# Altium schematic symbol library IC_ADI.SCHLIB: 3169 symbols (part 132 of 181) (continued)
## AD9148BBPZRL (continued)

## AD9200ARS
designator U?
Single 10-Bit Analog-to-Digital Converter with Parallel Interface, 80 mW, CMOS, 20MSPS, -40 to +85 degC, RS-28, Tube; Generic Part Number: AD9200; PartNumber: AD9200ARS; Resolution (Bits): 10; Channels: 1; Throughput Rate (SPS): 20M; Interface: Par; DatasheetVersion: Rev.E; PackageVersion: 060106-A; PackageReference: RS-28; PackageDescription: 28-Lead Shrink Small Outline Package [SSOP]; Supplier Part Number 1: AD9200ARS-ND; Supplier Part Number 2: 584-AD9200ARS; RoHS: N; Packing: Tube; Mounting Technology: Surface Mount; Code_JEDEC: MO-150-AH; ComponentLink1Description: Manufacturer URL; ComponentLink2Description: Datasheet; ComponentLink3Description: Package Specification; ComponentLink4Description: Product URL
footprint SSOP28_0.65 (Footprint not found)
pins: 1 AVSS (power) "Analog Ground", 2 DRVDD (power) "Digital Driver Supply", 3 D0 (hiz) "Bit 0, Least Significant Bit", 4 D1 (hiz) "Bit 1", 5 D2 (hiz) "Bit 2", 6 D3 (hiz) "Bit 3", 7 D4 (hiz) "Bit 4", 8 D5 (hiz) "Bit 5", 9 D6 (hiz) "Bit 6", 10 D7 (hiz) "Bit 7", 11 D8 (hiz) "Bit 8", 12 D9 (hiz) "Bit 9, Most Significant Bit", 13 OTR (hiz) "Out-of-Range Indicator", 14 DRVSS (power) "Digital Ground", 15 CLK (in) "Clock Input", 16 THREE-STATE (in) "HI: High Impedance State. LO: Normal Operation", 17 STBY (in) "HI: Power-Down Mode. LO: Normal Operation", 18 REFSENSE (in) "Reference Select", 19 CLAMP (in) "HI: Enable Clamp Mode. LO: No Clamp", 20 CLAMPIN (in) "Clamp Reference Input", 21 REFTS "Top Reference", 22 REFTF "Top Reference Decoupling", 23 MODE (in) "Mode Select", 24 REFBF "Bottom Reference Decoupling", 25 REFBS "Bottom Reference", 26 VREF (out) "Internal Reference Output", 27 AIN (in) "Analog Input", 28 AVDD (power) "Analog Supply"

## AD9200ARSZ
designator U?
Single 10-Bit Analog-to-Digital Converter with Parallel Interface, 80 mW, CMOS, 20MSPS, -40 to +85 degC, RS-28, Pb-Free, Tube; Generic Part Number: AD9200; PartNumber: AD9200ARSZ; Resolution (Bits): 10; Channels: 1; Throughput Rate (SPS): 20M; Interface: Par; DatasheetVersion: Rev.E; PackageVersion: 060106-A; PackageReference: RS-28; PackageDescription: 28-Lead Shrink Small Outline Package [SSOP]; Supplier Part Number 1: AD9200ARSZ-ND; Supplier Part Number 2: 59K7120; Supplier Part Number 3: 584-AD9200ARSZ; RoHS: Y; Packing: Tube; Mounting Technology: Surface Mount; Code_JEDEC: MO-150-AH; ComponentLink1Description: Manufacturer URL; ComponentLink2Description: Datasheet; ComponentLink3Description: Package Specification; ComponentLink4Description: Product URL
footprint SSOP28_0.65 (Footprint not found)
pins: 1 AVSS (power) "Analog Ground", 2 DRVDD (power) "Digital Driver Supply", 3 D0 (hiz) "Bit 0, Least Significant Bit", 4 D1 (hiz) "Bit 1", 5 D2 (hiz) "Bit 2", 6 D3 (hiz) "Bit 3", 7 D4 (hiz) "Bit 4", 8 D5 (hiz) "Bit 5", 9 D6 (hiz) "Bit 6", 10 D7 (hiz) "Bit 7", 11 D8 (hiz) "Bit 8", 12 D9 (hiz) "Bit 9, Most Significant Bit", 13 OTR (hiz) "Out-of-Range Indicator", 14 DRVSS (power) "Digital Ground", 15 CLK (in) "Clock Input", 16 THREE-STATE (in) "HI: High Impedance State. LO: Normal Operation", 17 STBY (in) "HI: Power-Down Mode. LO: Normal Operation", 18 REFSENSE (in) "Reference Select", 19 CLAMP (in) "HI: Enable Clamp Mode. LO: No Clamp", 20 CLAMPIN (in) "Clamp Reference Input", 21 REFTS "Top Reference", 22 REFTF "Top Reference Decoupling", 23 MODE (in) "Mode Select", 24 REFBF "Bottom Reference Decoupling", 25 REFBS "Bottom Reference", 26 VREF (out) "Internal Reference Output", 27 AIN (in) "Analog Input", 28 AVDD (power) "Analog Supply"

## AD9200JRSZ
designator U?
Single 10-Bit Analog-to-Digital Converter with Parallel Interface, 80 mW, CMOS, 20MSPS, 0 to +70 degC, RS-28, Pb-Free, Tube; Generic Part Number: AD9200; PartNumber: AD9200JRSZ; Resolution (Bits): 10; Channels: 1; Throughput Rate (SPS): 20M; Interface: Par; DatasheetVersion: Rev.E; PackageVersion: 060106-A; PackageReference: RS-28; PackageDescription: 28-Lead Shrink Small Outline Package [SSOP]; Supplier Part Number 1: AD9200JRSZ-ND; Supplier Part Number 2: 59K7122; Supplier Part Number 3: 584-AD9200JRSZ; RoHS: Y; Packing: Tube; Mounting Technology: Surface Mount; Code_JEDEC: MO-150-AH; ComponentLink1Description: Manufacturer URL; ComponentLink2Description: Datasheet; ComponentLink3Description: Package Specification; ComponentLink4Description: Product URL
footprint SSOP28_0.65 (Footprint not found)
pins: 1 AVSS (power) "Analog Ground", 2 DRVDD (power) "Digital Driver Supply", 3 D0 (hiz) "Bit 0, Least Significant Bit", 4 D1 (hiz) "Bit 1", 5 D2 (hiz) "Bit 2", 6 D3 (hiz) "Bit 3", 7 D4 (hiz) "Bit 4", 8 D5 (hiz) "Bit 5", 9 D6 (hiz) "Bit 6", 10 D7 (hiz) "Bit 7", 11 D8 (hiz) "Bit 8", 12 D9 (hiz) "Bit 9, Most Significant Bit", 13 OTR (hiz) "Out-of-Range Indicator", 14 DRVSS (power) "Digital Ground", 15 CLK (in) "Clock Input", 16 THREE-STATE (in) "HI: High Impedance State. LO: Normal Operation", 17 STBY (in) "HI: Power-Down Mode. LO: Normal Operation", 18 REFSENSE (in) "Reference Select", 19 CLAMP (in) "HI: Enable Clamp Mode. LO: No Clamp", 20 CLAMPIN (in) "Clamp Reference Input", 21 REFTS "Top Reference", 22 REFTF "Top Reference Decoupling", 23 MODE (in) "Mode Select", 24 REFBF "Bottom Reference Decoupling", 25 REFBS "Bottom Reference", 26 VREF (out) "Internal Reference Output", 27 AIN (in) "Analog Input", 28 AVDD (power) "Analog Supply"

## AD9201ARS
designator U?
Dual 10-Bit Analog-to-Digital Converter with Parallel Interface, 20MSPS, -40 to +85 degC, RS-28, Tube; Generic Part Number: AD9201; PartNumber: AD9201ARS; Resolution (Bits): 10; Channels: 2; Throughput Rate (SPS): 20M; Interface: Par; DatasheetVersion: Rev.D; PackageVersion: 060106-A; PackageReference: RS-28; PackageDescription: 28-Lead Shrink Small Outline Package [SSOP]; Supplier Part Number 1: AD9201ARS-ND; Supplier Part Number 2: 117109; Supplier Part Number 3: 584-AD9201ARS; RoHS: N; Packing: Tube; Mounting Technology: Surface Mount; Code_JEDEC: MO-150-AH; ComponentLink1Description: Manufacturer URL; ComponentLink2Description: Datasheet; ComponentLink3Description: Package Specification; ComponentLink4Description: Product URL
footprint SSOP28_0.65 (Footprint not found)
pins: 1 DVSS (power) "Digital Ground", 2 DVDD (power) "Digital Supply", 3 D0 (hiz) "Bit 0 (LSB)", 4 D1 (hiz) "Bit 1", 5 D2 (hiz) "Bit 2", 6 D3 (hiz) "Bit 3", 7 D4 (hiz) "Bit 4", 8 D5 (hiz) "Bit 5", 9 D6 (hiz) "Bit 6", 10 D7 (hiz) "Bit 7", 11 D8 (hiz) "Bit 8", 12 D9 (hiz) "Bit 9 (MSB)", 13 SELECT (in) "Hi I Channel Out, Lo Q Channel Out", 14 CLOCK (in) "Clock", 15 SLEEP (in) "Hi Power Down, Lo Normal Operation", 16 INA-I (in) "I Channel, A Input", 17 INB-I (in) "I Channel, B Input", 18 REFT-I "Top Reference Decoupling, I Channel", 19 REFB-I "Bottom Reference Decoupling, I Channel", 20 AVSS (power) "Analog Ground", 21 REFSENSE (in) "Reference Select", 22 VREF (out) "Internal Reference Output", 23 AVDD (power) "Analog Supply", 24 REFB-Q "Bottom Reference Decoupling, Q Channel", 25 REFT-Q "Top Reference Decoupling, Q Channel", 26 INB-Q (in) "Q Channel, B Input", 27 INA-Q (in) "Q Channel, A Input", 28 CHIP-SELECT (in) "Hi-High Impedance, Lo-Normal Operation"

## AD9201ARSRL
designator U?
Dual 10-Bit Analog-to-Digital Converter with Parallel Interface, 20MSPS, -40 to +85 degC, RS-28, Reel; Generic Part Number: AD9201; PartNumber: AD9201ARSRL; Resolution (Bits): 10; Channels: 2; Throughput Rate (SPS): 20M; Interface: Par; DatasheetVersion: Rev.D; PackageVersion: 060106-A; PackageReference: RS-28; PackageDescription: 28-Lead Shrink Small Outline Package [SSOP]; Supplier Part Number 1: AD9201ARSRL-ND; Supplier Part Number 2: 584-AD9201ARSR; RoHS: N; Packing: Reel; Mounting Technology: Surface Mount; Code_JEDEC: MO-150-AH; ComponentLink1Description: Manufacturer URL; ComponentLink2Description: Datasheet; ComponentLink3Description: Package Specification; ComponentLink4Description: Product URL
footprint SSOP28_0.65 (Footprint not found)
pins: 1 DVSS (power) "Digital Ground", 2 DVDD (power) "Digital Supply", 3 D0 (hiz) "Bit 0 (LSB)", 4 D1 (hiz) "Bit 1", 5 D2 (hiz) "Bit 2", 6 D3 (hiz) "Bit 3", 7 D4 (hiz) "Bit 4", 8 D5 (hiz) "Bit 5", 9 D6 (hiz) "Bit 6", 10 D7 (hiz) "Bit 7", 11 D8 (hiz) "Bit 8", 12 D9 (hiz) "Bit 9 (MSB)", 13 SELECT (in) "Hi I Channel Out, Lo Q Channel Out", 14 CLOCK (in) "Clock", 15 SLEEP (in) "Hi Power Down, Lo Normal Operation", 16 INA-I (in) "I Channel, A Input", 17 INB-I (in) "I Channel, B Input", 18 REFT-I "Top Reference Decoupling, I Channel", 19 REFB-I "Bottom Reference Decoupling, I Channel", 20 AVSS (power) "Analog Ground", 21 REFSENSE (in) "Reference Select", 22 VREF (out) "Internal Reference Output", 23 AVDD (power) "Analog Supply", 24 REFB-Q "Bottom Reference Decoupling, Q Channel", 25 REFT-Q "Top Reference Decoupling, Q Channel", 26 INB-Q (in) "Q Channel, B Input", 27 INA-Q (in) "Q Channel, A Input", 28 CHIP-SELECT (in) "Hi-High Impedance, Lo-Normal Operation"

## AD9201ARSZ
designator U?
Dual 10-Bit Analog-to-Digital Converter with Parallel Interface, 20MSPS, -40 to +85 degC, RS-28, Pb-Free, Tube; Generic Part Number: AD9201; PartNumber: AD9201ARSZ; Resolution (Bits): 10; Channels: 2; Throughput Rate (SPS): 20M; Interface: Par; DatasheetVersion: Rev.D; PackageVersion: 060106-A; PackageReference: RS-28; PackageDescription: 28-Lead Shrink Small Outline Package [SSOP]; Supplier Part Number 1: AD9201ARSZ-ND; Supplier Part Number 2: 1079291; Supplier Part Number 3: 19M1005; Supplier Part Number 4: 584-AD9201ARSZ; RoHS: Y; Packing: Tube; Mounting Technology: Surface Mount; Code_JEDEC: MO-150-AH; ComponentLink1Description: Manufacturer URL; ComponentLink2Description: Datasheet; ComponentLink3Description: Package Specification; ComponentLink4Description: Product URL
footprint SSOP28_0.65 (Footprint not found)
pins: 1 DVSS (power) "Digital Ground", 2 DVDD (power) "Digital Supply", 3 D0 (hiz) "Bit 0 (LSB)", 4 D1 (hiz) "Bit 1", 5 D2 (hiz) "Bit 2", 6 D3 (hiz) "Bit 3", 7 D4 (hiz) "Bit 4", 8 D5 (hiz) "Bit 5", 9 D6 (hiz) "Bit 6", 10 D7 (hiz) "Bit 7", 11 D8 (hiz) "Bit 8", 12 D9 (hiz) "Bit 9 (MSB)", 13 SELECT (in) "Hi I Channel Out, Lo Q Channel Out", 14 CLOCK (in) "Clock", 15 SLEEP (in) "Hi Power Down, Lo Normal Operation", 16 INA-I (in) "I Channel, A Input", 17 INB-I (in) "I Channel, B Input", 18 REFT-I "Top Reference Decoupling, I Channel", 19 REFB-I "Bottom Reference Decoupling, I Channel", 20 AVSS (power) "Analog Ground", 21 REFSENSE (in) "Reference Select", 22 VREF (out) "Internal Reference Output", 23 AVDD (power) "Analog Supply", 24 REFB-Q "Bottom Reference Decoupling, Q Channel", 25 REFT-Q "Top Reference Decoupling, Q Channel", 26 INB-Q (in) "Q Channel, B Input", 27 INA-Q (in) "Q Channel, A Input", 28 CHIP-SELECT (in) "Hi-High Impedance, Lo-Normal Operation"

## AD9201ARSZRL
designator U?
Dual 10-Bit Analog-to-Digital Converter with Parallel Interface, 20MSPS, -40 to +85 degC, RS-28, Pb-Free, Reel; Generic Part Number: AD9201; PartNumber: AD9201ARSZRL; Resolution (Bits): 10; Channels: 2; Throughput Rate (SPS): 20M; Interface: Par; DatasheetVersion: Rev.D; PackageVersion: 060106-A; PackageReference: RS-28; PackageDescription: 28-Lead Shrink Small Outline Package [SSOP]; Supplier Part Number 1: AD9201ARSZRLTR-ND; Supplier Part Number 2: AD9201ARSZRLCT-ND; Supplier Part Number 3: AD9201ARSZRLDKR-ND; Supplier Part Number 4: 28M4165; Supplier Part Number 5: 584-AD9201ARSZR; RoHS: Y; Packing: Reel; Mounting Technology: Surface Mount; Code_JEDEC: MO-150-AH; ComponentLink1Description: Manufacturer URL; ComponentLink2Description: Datasheet; ComponentLink3Description: Package Specification; ComponentLink4Description: Product URL
footprint SSOP28_0.65 (Footprint not found)
pins: 1 DVSS (power) "Digital Ground", 2 DVDD (power) "Digital Supply", 3 D0 (hiz) "Bit 0 (LSB)", 4 D1 (hiz) "Bit 1", 5 D2 (hiz) "Bit 2", 6 D3 (hiz) "Bit 3", 7 D4 (hiz) "Bit 4", 8 D5 (hiz) "Bit 5", 9 D6 (hiz) "Bit 6", 10 D7 (hiz) "Bit 7", 11 D8 (hiz) "Bit 8", 12 D9 (hiz) "Bit 9 (MSB)", 13 SELECT (in) "Hi I Channel Out, Lo Q Channel Out", 14 CLOCK (in) "Clock", 15 SLEEP (in) "Hi Power Down, Lo Normal Operation", 16 INA-I (in) "I Channel, A Input", 17 INB-I (in) "I Channel, B Input", 18 REFT-I "Top Reference Decoupling, I Channel", 19 REFB-I "Bottom Reference Decoupling, I Channel", 20 AVSS (power) "Analog Ground", 21 REFSENSE (in) "Reference Select", 22 VREF (out) "Internal Reference Output", 23 AVDD (power) "Analog Supply", 24 REFB-Q "Bottom Reference Decoupling, Q Channel", 25 REFT-Q "Top Reference Decoupling, Q Channel", 26 INB-Q (in) "Q Channel, B Input", 27 INA-Q (in) "Q Channel, A Input", 28 CHIP-SELECT (in) "Hi-High Impedance, Lo-Normal Operation"

## AD9203ARU
designator U?
Single 10-Bit Analog-to-Digital Converter with Parallel Interface, 74 mW, 40MSPS, -40 to +85 degC, RU-28, Tube; Generic Part Number: AD9203; PartNumber: AD9203ARU; Resolution (Bits): 10; Channels: 1; Throughput Rate (SPS): 40M; Interface: Par; DatasheetVersion: Rev.B; PackageVersion: 2005; PackageReference: RU-28; PackageDescription: 28-Lead Thin Shrink Small Outline Package [TSSOP]; Supplier Part Number 1: AD9203ARU-ND; Supplier Part Number 2: 584-AD9203ARU; RoHS: N; Packing: Tube; Mounting Technology: Surface Mount; Code_JEDEC: MO-153-AE; ComponentLink1Description: Manufacturer URL; ComponentLink2Description: Datasheet; ComponentLink3Description: Package Specification; ComponentLink4Description: Product URL
footprint TSSOP28_0.65 (Footprint not found)
pins: 1 DRVSS (power) "Digital Ground.", 2 DRVDD (power) "Digital Supply.", 3 D0 (hiz) "Bit 0, Least Significant Bit.", 4 D1 (hiz) "Bit 1.", 5 D2 (hiz) "Bit 2.", 6 D3 (hiz) "Bit 3.", 7 D4 (hiz) "Bit 4.", 8 D5 (hiz) "Bit 5.", 9 D6 (hiz) "Bit 6.", 10 D7 (hiz) "Bit 7.", 11 D8 (hiz) "Bit 8.", 12 D9 (hiz) "Bit 9, Most Significant Bit.", 13 OTR (out) "Out-of-Range Indicator.", 14 DFS (in) "Data Format Select HI: Twos Complement; LO: Straight Binary.", 15 CLK (in) "Clock Input.", 16 3-STATE (in) "HI: High Impedance State Output; LO: Active Digital Output Drives.", 17 STBY (in) "HI: Power-Down Mode; LO: Normal Operation.", 18 REFSENSE (in) "Reference Select.", 19 CLAMP (in) "HI: Enable Clamp; LO: Open Clamp.", 20 CLAMPIN (in) "Clamp Signal Input.", 21 PWRCON (in) "Power Control Input.", 22 REFTF "Top Reference Decoupling.", 23 VREF (io) "Reference In/Out.", 24 REFBF "Bottom Reference Decoupling.", 25 AINP (in) "Noninverting Analog Input.", 26 AINN (in) "Inverting Analog Input.", 27 AVSS (power) "Analog Ground.", 28 AVDD (power) "Analog Supply."

## AD9203ARUZ
designator U?
Single 10-Bit Analog-to-Digital Converter with Parallel Interface, 74 mW, 40MSPS, -40 to +85 degC, RU-28, Pb-Free,Tube; Generic Part Number: AD9203; PartNumber: AD9203ARUZ; Resolution (Bits): 10; Channels: 1; Throughput Rate (SPS): 40M; Interface: Par; DatasheetVersion: Rev.B; PackageVersion: 2005; PackageReference: RU-28; PackageDescription: 28-Lead Thin Shrink Small Outline Package [TSSOP]; Supplier Part Number 1: AD9203ARUZ-ND; Supplier Part Number 2: 2305578; Supplier Part Number 3: 82H3049; Supplier Part Number 4: 584-AD9203ARUZ; RoHS: Y; Packing: Tube; Mounting Technology: Surface Mount; Code_JEDEC: MO-153-AE; ComponentLink1Description: Manufacturer URL; ComponentLink2Description: Datasheet; ComponentLink3Description: Package Specification; ComponentLink4Description: Product URL
footprint TSSOP28_0.65 (Footprint not found)
pins: 1 DRVSS (power) "Digital Ground.", 2 DRVDD (power) "Digital Supply.", 3 D0 (hiz) "Bit 0, Least Significant Bit.", 4 D1 (hiz) "Bit 1.", 5 D2 (hiz) "Bit 2.", 6 D3 (hiz) "Bit 3.", 7 D4 (hiz) "Bit 4.", 8 D5 (hiz) "Bit 5.", 9 D6 (hiz) "Bit 6.", 10 D7 (hiz) "Bit 7.", 11 D8 (hiz) "Bit 8.", 12 D9 (hiz) "Bit 9, Most Significant Bit.", 13 OTR (out) "Out-of-Range Indicator.", 14 DFS (in) "Data Format Select HI: Twos Complement; LO: Straight Binary.", 15 CLK (in) "Clock Input.", 16 3-STATE (in) "HI: High Impedance State Output; LO: Active Digital Output Drives.", 17 STBY (in) "HI: Power-Down Mode; LO: Normal Operation.", 18 REFSENSE (in) "Reference Select.", 19 CLAMP (in) "HI: Enable Clamp; LO: Open Clamp.", 20 CLAMPIN (in) "Clamp Signal Input.", 21 PWRCON (in) "Power Control Input.", 22 REFTF "Top Reference Decoupling.", 23 VREF (io) "Reference In/Out.", 24 REFBF "Bottom Reference Decoupling.", 25 AINP (in) "Noninverting Analog Input.", 26 AINN (in) "Inverting Analog Input.", 27 AVSS (power) "Analog Ground.", 28 AVDD (power) "Analog Supply."

## AD9203ARUZRL7
designator U?
Single 10-Bit Analog-to-Digital Converter with Parallel Interface, 74 mW, 40MSPS, 0 to +70 degC, RU-28, Pb-Free, Reel; Generic Part Number: AD9203; PartNumber: AD9203ARUZRL7; Resolution (Bits): 10; Channels: 1; Throughput Rate (SPS): 40M; Interface: Par; DatasheetVersion: Rev.B; PackageVersion: 2005; PackageReference: RU-28; PackageDescription: 28-Lead Thin Shrink Small Outline Package [TSSOP]; Supplier Part Number 1: AD9203ARUZRL7TR-ND; Supplier Part Number 2: AD9203ARUZRL7CT-ND; Supplier Part Number 3: AD9203ARUZRL7DKR-ND; Supplier Part Number 4: 82H3050; Supplier Part Number 5: 584-AD9203ARUZR7; RoHS: Y; Packing: Reel; Mounting Technology: Surface Mount; Code_JEDEC: MO-153-AE; ComponentLink1Description: Manufacturer URL; ComponentLink2Description: Datasheet; ComponentLink3Description: Package Specification; ComponentLink4Description: Product URL
footprint TSSOP28_0.65 (Footprint not found)
pins: 1 DRVSS (power) "Digital Ground.", 2 DRVDD (power) "Digital Supply.", 3 D0 (hiz) "Bit 0, Least Significant Bit.", 4 D1 (hiz) "Bit 1.", 5 D2 (hiz) "Bit 2.", 6 D3 (hiz) "Bit 3.", 7 D4 (hiz) "Bit 4.", 8 D5 (hiz) "Bit 5.", 9 D6 (hiz) "Bit 6.", 10 D7 (hiz) "Bit 7.", 11 D8 (hiz) "Bit 8.", 12 D9 (hiz) "Bit 9, Most Significant Bit.", 13 OTR (out) "Out-of-Range Indicator.", 14 DFS (in) "Data Format Select HI: Twos Complement; LO: Straight Binary.", 15 CLK (in) "Clock Input.", 16 3-STATE (in) "HI: High Impedance State Output; LO: Active Digital Output Drives.", 17 STBY (in) "HI: Power-Down Mode; LO: Normal Operation.", 18 REFSENSE (in) "Reference Select.", 19 CLAMP (in) "HI: Enable Clamp; LO: Open Clamp.", 20 CLAMPIN (in) "Clamp Signal Input.", 21 PWRCON (in) "Power Control Input.", 22 REFTF "Top Reference Decoupling.", 23 VREF (io) "Reference In/Out.", 24 REFBF "Bottom Reference Decoupling.", 25 AINP (in) "Noninverting Analog Input.", 26 AINN (in) "Inverting Analog Input.", 27 AVSS (power) "Analog Ground.", 28 AVDD (power) "Analog Supply."

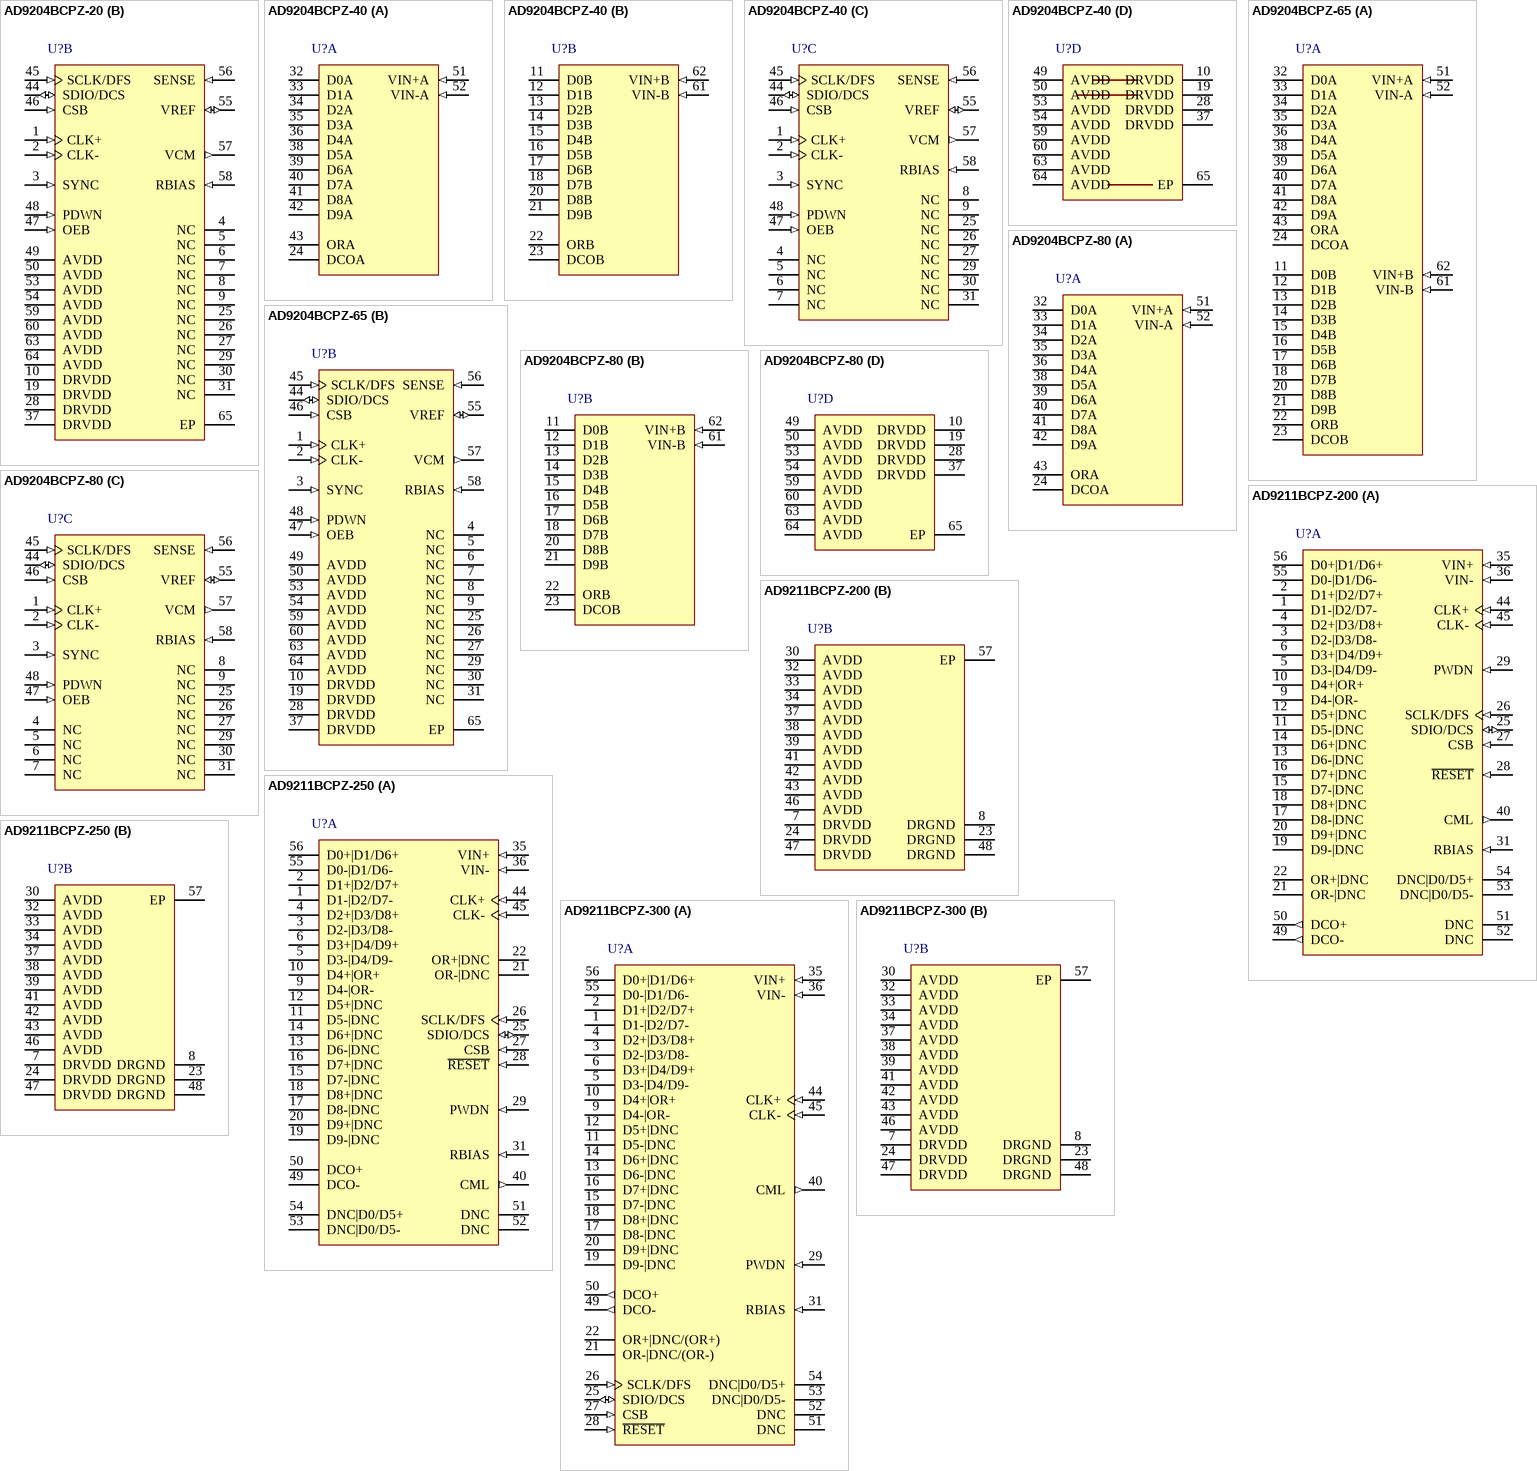
[diagram p104: symbols AD9204BCPZ-20 to AD9211BCPZ-300]

## AD9204BCPZ-20
designator U?
Dual 10-Bit Analog-to-Digital Converter with Parallel Interface, 1.8 V, 20MSPS, -40 to +85 degC, CP-64-4, Pb-Free, Tray; Generic Part Number: AD9204-20; PartNumber: AD9204BCPZ-20; Resolution (Bits): 10; Channels: 2; Throughput Rate (SPS): 20M; Interface: Par; DatasheetVersion: Rev.0; PackageVersion: 051007-C; PackageReference: CP-64-4; PackageDescription: 64-Lead Lead Frame Chip Scale Package [LFCSP_VQ] 9 x 9 mm Body, Very Thin Quad; Supplier Part Number 1: AD9204BCPZ-20-ND; Supplier Part Number 2: 26R2489; Supplier Part Number 3: 584-AD9204BCPZ-20; RoHS: Y; Packing: Tray; Mounting Technology: Surface Mount; Code_JEDEC: MO-220-VMMD-4; ComponentLink1Description: Manufacturer URL; ComponentLink2Description: Datasheet; ComponentLink3Description: Package Specification; ComponentLink4Description: Product URL
footprint QFN64_0.5-PAD(9X9) (Footprint not found)
part A pins: 11 D0B (LSB) (hiz) "Channel B Digital Outputs.D9B = MSB.", 12 D1B (hiz) "Channel B Digital Outputs.D9B = MSB.", 13 D2B (hiz) "Channel B Digital Outputs.D9B = MSB.", 14 D3B (hiz) "Channel B Digital Outputs.D9B = MSB.", 15 D4B (hiz) "Channel B Digital Outputs.D9B = MSB.", 16 D5B (hiz) "Channel B Digital Outputs.D9B = MSB.", 17 D6B (hiz) "Channel B Digital Outputs.D9B = MSB.", 18 D7B (hiz) "Channel B Digital Outputs.D9B = MSB.", 20 D8B (hiz) "Channel B Digital Outputs.D9B = MSB.", 21 D9B (MSB) (hiz) "Channel B Digital Outputs.D9B = MSB.", 22 ORB (hiz) "Channel B Out-of-Range Digital Output.", 23 DCOB (hiz) "Channel B Data Clock Digital Output.", 24 DCOA (hiz) "Channel A Data Clock Digital Output.", 32 D0A (LSB) (hiz) "Channel A Digital Outputs.D9A = MSB.", 33 D1A (hiz) "Channel A Digital Outputs.D9A = MSB.", 34 D2A (hiz) "Channel A Digital Outputs.D9A = MSB.", 35 D3A (hiz) "Channel A Digital Outputs.D9A = MSB.", 36 D4A (hiz) "Channel A Digital Outputs.D9A = MSB.", 38 D5A (hiz) "Channel A Digital Outputs.D9A = MSB.", 39 D6A (hiz) "Channel A Digital Outputs.D9A = MSB.", 40 D7A (hiz) "Channel A Digital Outputs.D9A = MSB.", 41 D8A (hiz) "Channel A Digital Outputs.D9A = MSB.", 42 D9A (MSB) (hiz) "Channel A Digital Outputs.D9A = MSB.", 43 ORA (hiz) "Channel A Out-of-Range Digital Output.", 51 VIN+A (in) "Channel A Analog Inputs.", 52 VIN-A (in) "Channel A Analog Inputs.", 61 VIN-B (in) "Channel B Analog Inputs.", 62 VIN+B (in) "Channel B Analog Inputs."
part B pins: 1 CLK+ (in) "Differential Encode Clock. PECL, LVDS, or 1.8 V CMOS inputs.", 2 CLK- (in) "Differential Encode Clock. PECL, LVDS, or 1.8 V CMOS inputs.", 3 SYNC (in) "Digital Input. SYNC input to clock divider. 30 k ohm internal pull-down", 4 NC "Do Not Connect.", 5 NC "Do Not Connect.", 6 NC "Do Not Connect.", 7 NC "Do Not Connect.", 8 NC "Do Not Connect.", 9 NC "Do Not Connect.", 10 DRVDD (power) "Digital Output Driver Supply (1.8 V to 3.3 V).", 19 DRVDD (power) "Digital Output Driver Supply (1.8 V to 3.3 V).", 25 NC "Do Not Connect.", 26 NC "Do Not Connect.", 27 NC "Do Not Connect.", 28 DRVDD (power) "Digital Output Driver Supply (1.8 V to 3.3 V).", 29 NC "Do Not Connect.", 30 NC "Do Not Connect.", 31 NC "Do Not Connect.", 37 DRVDD (power) "Digital Output Driver Supply (1.8 V to 3.3 V).", 44 SDIO/DCS (io) "SPI Data Input/Output (SDIO). Bidirectional SPI Data I/O in SPI mode. 30 k ohm internal pulldown in SPI mode.  Duty Cycle Stabilizer (DCS). Static enable input for duty cycle stabilizer in non-SPI mode. 30 k ohm  internal (See Datasheet)", 45 SCLK/DFS (in) "SPI Clock (SCLK) Input in SPI mode. 30 k ohm internal pull-down.Data Format Select (DFS). Static control of data output format in non-SPI mode. 30 kO internal pull-down.DFS high = twos complement output.  DFS low = offset (See Datasheet)", 46 CSB (in) "SPI Chip Select. Active low enable; 30 k ohm internal pull-up", 47 OEB (in) "Digital Input. Enable Channel A and Channel B digital outputs if low, three-state outputs if high. 30 kohm internal pull-down.", 48 PDWN (in) "Digital Input. 30 kohm internal pull-down.PDWN high = power-down device.PDWN low = run device, normal operation.", 49 AVDD (power) "1.8 V Analog Supply Pins", 50 AVDD (power) "1.8 V Analog Supply Pins", 53 AVDD (power) "1.8 V Analog Supply Pins", 54 AVDD (power) "1.8 V Analog Supply Pins", 55 VREF (io) "Voltage Reference Input/Output", 56 SENSE (in) "Reference Mode Selection", 57 VCM (out) "Analog output voltage at midsupply to set common mode of the analog inputs.", 58 RBIAS (in) "Sets Analog Current Bias. Connect to 10 kohm (1% tolerance) resistor to ground.", 59 AVDD (power) "1.8 V Analog Supply Pins", 60 AVDD (power) "1.8 V Analog Supply Pins", 63 AVDD (power) "1.8 V Analog Supply Pins", 64 AVDD (power) "1.8 V Analog Supply Pins", 65 EP (power) "Exposed paddle is the only ground connection for the chip. Must be connected to PCB AGND."

## AD9204BCPZ-40
designator U?
Dual 10-Bit Analog-to-Digital Converter with Parallel Interface, 1.8 V, 40MSPS, -40 to +85 degC, CP-64-4, Pb-Free, Tray; Generic Part Number: AD9204-40; PartNumber: AD9204BCPZ-40; Resolution (Bits): 10; Channels: 2; Throughput Rate (SPS): 40M; Interface: Par; DatasheetVersion: Rev.0; PackageVersion: 051007-C; PackageReference: CP-64-4; PackageDescription: 64-Lead Lead Frame Chip Scale Package [LFCSP_VQ] 9 x 9 mm Body, Very Thin Quad; Supplier Part Number 1: AD9204BCPZ-40-ND; Supplier Part Number 2: 584-AD9204BCPZ-40; RoHS: Y; Packing: Tray; Mounting Technology: Surface Mount; Code_JEDEC: MO-220-VMMD-4; ComponentLink1Description: Manufacturer URL; ComponentLink2Description: Datasheet; ComponentLink3Description: Package Specification; ComponentLink4Description: Product URL
footprint QFN64_0.5-PAD(9X9) (Footprint not found)
part A pins: 24 DCOA (hiz) "Channel A Data Clock Digital Output.", 32 D0A (hiz) "Channel A Digital Output", 33 D1A (hiz) "Channel A Digital Output", 34 D2A (hiz) "Channel A Digital Output.", 35 D3A (hiz) "Channel A Digital Output", 36 D4A (hiz) "Channel A Digital Output", 38 D5A (hiz) "Channel A Digital Output.", 39 D6A (hiz) "Channel A Digital Output.", 40 D7A (hiz) "Channel A Digital Output", 41 D8A (hiz) "Channel A Digital Output", 42 D9A (hiz) "Channel A Digital Output D9A = MSB.", 43 ORA (hiz) "Channel A Out-of-Range Digital Output.", 51 VIN+A (in) "Channel A Analog Inputs.", 52 VIN-A (in) "Channel A Analog Inputs."
part B pins: 11 D0B (hiz) "Channel B Digital Output.", 12 D1B (hiz) "Channel B Digital Output.", 13 D2B (hiz) "Channel B Digital Output", 14 D3B (hiz) "Channel B Digital Output.", 15 D4B (hiz) "Channel B Digital Output.", 16 D5B (hiz) "Channel B Digital Output.", 17 D6B (hiz) "Channel B Digital Output", 18 D7B (hiz) "Channel B Digital Output.", 20 D8B (hiz) "Channel B Digital Output.", 21 D9B (hiz) "Channel B Digital Output D9B = MSB.", 22 ORB (hiz) "Channel B Out-of-Range Digital Output.", 23 DCOB (hiz) "Channel B Data Clock Digital Output.", 61 VIN-B (in) "Channel B Analog Inputs.", 62 VIN+B (in) "Channel B Analog Inputs."
part C pins: 1 CLK+ (in) "Differential Encode Clock. PECL, LVDS, or 1.8 V CMOS inputs.", 2 CLK- (in) "Differential Encode Clock. PECL, LVDS, or 1.8 V CMOS inputs.", 3 SYNC (in) "Digital Input. SYNC input to clock divider. 30 kohm internal pull-down.", 4 NC "Do Not Connect.", 5 NC "Do Not Connect.", 6 NC "Do Not Connect.", 7 NC "Do Not Connect.", 8 NC "Do Not Connect.", 9 NC "Do Not Connect.", 25 NC "Do Not Connect.", 26 NC "Do Not Connect.", 27 NC "Do Not Connect.", 29 NC "Do Not Connect.", 30 NC "Do Not Connect.", 31 NC "Do Not Connect.", 44 SDIO/DCS (io) "SPI Data Input/Output (SDIO). Bidirectional SPI Data I/O in SPI mode. 30 k ohm internal pull-down in SPI mode.Duty Cycle Stabilizer (DCS). Static enable input for duty cycle stabilizer in non-SPI mode. 30 k ohm internal pull-up in (See Datasheet)", 45 SCLK/DFS (in) "SPI Clock (SCLK) Input in SPI mode. 30 k ohm internal pull-down.Data Format Select (DFS). Static control of data output format in non-SPI mode. 30 k ohm internal pull-down. DFS high = twos complement output. DFS low = offset (See Datasheet)", 46 CSB (in) "SPI Chip Select. Active low enable; 30 kohm internal pull-up.", 47 OEB (in) "Digital Input. Enable Channel A and Channel B digital outputs if low, three-state outputs if high. 30 k ohm internal pull-down.", 48 PDWN (in) "Digital Input. 30 k ohm internal pull-down.PDWN high = power-down device.PDWN low = run device, normal operation.", 55 VREF (io) "Voltage Reference Input/Output.", 56 SENSE (in) "Reference Mode Selection.", 57 VCM (out) "Analog output voltage at midsupply to set common mode of the analog inputs.", 58 RBIAS (in) "Sets Analog Current Bias. Connect to 10 k ohm (1% tolerance) resistor to ground."
part D pins: 10 DRVDD (power) "Digital Output Driver Supply (1.8 V to 3.3 V).", 19 DRVDD (power) "Digital Output Driver Supply (1.8 V to 3.3 V).", 28 DRVDD (power) "Digital Output Driver Supply (1.8 V to 3.3 V).", 37 DRVDD (power) "Digital Output Driver Supply (1.8 V to 3.3 V).", 49 AVDD (power) "1.8 V Analog Supply Pins.", 50 AVDD (power) "1.8 V Analog Supply Pins.", 53 AVDD (power) "1.8 V Analog Supply Pins.", 54 AVDD (power) "1.8 V Analog Supply Pins.", 59 AVDD (power) "1.8 V Analog Supply Pins.", 60 AVDD (power) "1.8 V Analog Supply Pins.", 63 AVDD (power) "1.8 V Analog Supply Pins.", 64 AVDD (power) "1.8 V Analog Supply Pins.", 65 EP (power) "Exposed paddle is the only ground connection for the chip. Must be connected to PCB AGND."

## AD9204BCPZ-65
designator U?
Dual 10-Bit Analog-to-Digital Converter with Parallel Interface, 1.8 V, 65MSPS, -40 to +85 degC, CP-64-4, Pb-Free, Tray; Generic Part Number: AD9204-65; PartNumber: AD9204BCPZ-65; Resolution (Bits): 10; Channels: 2; Throughput Rate (SPS): 65M; Interface: Par; DatasheetVersion: Rev.0; PackageVersion: 051007-C; PackageReference: CP-64-4; PackageDescription: 64-Lead Lead Frame Chip Scale Package [LFCSP_VQ] 9 x 9 mm Body, Very Thin Quad; Supplier Part Number 1: AD9204BCPZ-65-ND; Supplier Part Number 2: 584-AD9204BCPZ-65; RoHS: Y; Packing: Tray; Mounting Technology: Surface Mount; Code_JEDEC: MO-220-VMMD-4; ComponentLink1Description: Manufacturer URL; ComponentLink2Description: Datasheet; ComponentLink3Description: Package Specification; ComponentLink4Description: Product URL
footprint QFN64_0.5-PAD(9X9) (Footprint not found)
part A pins: 11 D0B (hiz) "Channel B Digital Outputs.", 12 D1B (hiz) "Channel B Digital Outputs.", 13 D2B (hiz) "Channel B Digital Outputs.", 14 D3B (hiz) "Channel B Digital Outputs.", 15 D4B (hiz) "Channel B Digital Outputs.", 16 D5B (hiz) "Channel B Digital Outputs.", 17 D6B (hiz) "Channel B Digital Outputs.", 18 D7B (hiz) "Channel B Digital Outputs.", 20 D8B (hiz) "Channel B Digital Outputs.", 21 D9B (hiz) "Channel B Digital Outputs. D9B = MSB.", 22 ORB (hiz) "Channel B Out-of-Range Digital Output.", 23 DCOB (hiz) "Channel B Data Clock Digital Output.", 24 DCOA (hiz) "Channel A Data Clock Digital Output.", 32 D0A (hiz) "Channel A Digital Outputs.", 33 D1A (hiz) "Channel A Digital Outputs.", 34 D2A (hiz) "Channel A Digital Outputs.", 35 D3A (hiz) "Channel A Digital Outputs.", 36 D4A (hiz) "Channel A Digital Outputs.", 38 D5A (hiz) "Channel A Digital Outputs.", 39 D6A (hiz) "Channel A Digital Outputs.", 40 D7A (hiz) "Channel A Digital Outputs.", 41 D8A (hiz) "Channel A Digital Outputs.", 42 D9A (hiz) "Channel A Digital Outputs. D9A = MSB.", 43 ORA (hiz) "Channel A Out-of-Range Digital Output.", 51 VIN+A (in) "Channel A Analog Inputs.", 52 VIN-A (in) "Channel A Analog Inputs.", 61 VIN-B (in) "Channel B Analog Inputs.", 62 VIN+B (in) "Channel B Analog Inputs."
part B pins: 1 CLK+ (in) "Differential Encode Clock. PECL, LVDS, or 1.8 V CMOS inputs.", 2 CLK- (in) "Differential Encode Clock. PECL, LVDS, or 1.8 V CMOS inputs.", 3 SYNC (in) "Digital Input. SYNC input to clock divider. 30 kO internal pull-down.", 4 NC "Do Not Connect.", 5 NC "Do Not Connect.", 6 NC "Do Not Connect.", 7 NC "Do Not Connect.", 8 NC "Do Not Connect.", 9 NC "Do Not Connect.", 10 DRVDD (power) "Digital Output Driver Supply (1.8 V to 3.3 V).", 19 DRVDD (power) "Digital Output Driver Supply (1.8 V to 3.3 V).", 25 NC "Do Not Connect.", 26 NC "Do Not Connect.", 27 NC "Do Not Connect.", 28 DRVDD (power) "Digital Output Driver Supply (1.8 V to 3.3 V).", 29 NC "Do Not Connect.", 30 NC "Do Not Connect.", 31 NC "Do Not Connect.", 37 DRVDD (power) "Digital Output Driver Supply (1.8 V to 3.3 V).", 44 SDIO/DCS (io) "SPI Data Input/Output (SDIO). Bidirectional SPI Data I/O in SPI mode. 30 kO internal pull-down in SPI mode.Duty Cycle Stabilizer (DCS). Static enable input for duty cycle stabilizer in non-SPI mode. 30 kO internal pull-up in (See Datasheet)", 45 SCLK/DFS (in) "SPI Clock (SCLK) Input in SPI mode. 30 kO internal pull-down.Data Format Select (DFS). Static control of data output format in non-SPI mode. 30 kO internal pull-down. DFS high = twos complement output. DFS low = offset (See Datasheet)", 46 CSB (in) "SPI Chip Select. Active low enable; 30 kO internal pull-up.", 47 OEB (in) "Digital Input. Enable Channel A and Channel B digital outputs if low, three-state outputs if high. 30 kO internal pull-down.", 48 PDWN (in) "Digital Input. 30 kO internal pull-down.PDWN high = power-down device.PDWN low = run device, normal operation.", 49 AVDD (power) "1.8 V Analog Supply Pins.", 50 AVDD (power) "1.8 V Analog Supply Pins.", 53 AVDD (power) "1.8 V Analog Supply Pins.", 54 AVDD (power) "1.8 V Analog Supply Pins.", 55 VREF (io) "Voltage Reference Input/Output.", 56 SENSE (in) "Reference Mode Selection.", 57 VCM (out) "Analog output voltage at midsupply to set common mode of the analog inputs.", 58 RBIAS (in) "Sets Analog Current Bias. Connect to 10 kO (1% tolerance) resistor to ground.", 59 AVDD (power) "1.8 V Analog Supply Pins.", 60 AVDD (power) "1.8 V Analog Supply Pins.", 63 AVDD (power) "1.8 V Analog Supply Pins.", 64 AVDD (power) "1.8 V Analog Supply Pins.", 65 EP (power) "Exposed paddle is the only ground connection for the chip. Must be connected to PCB AGND."